# Altium footprint library Molex FFC - FPC Connectors (SMT).PcbLib: 638 footprints (part 3 of 40)
Each footprint in its own frame and in the unit in brackets; x right, y up, seen from the top. Pads: shape width x height; smd on the part's side, far side on the other; paste and mask are expansions set on the pad; w line width, h text height; cw(c..) or ccw(c..) is an arc to the next point about the centre after c.
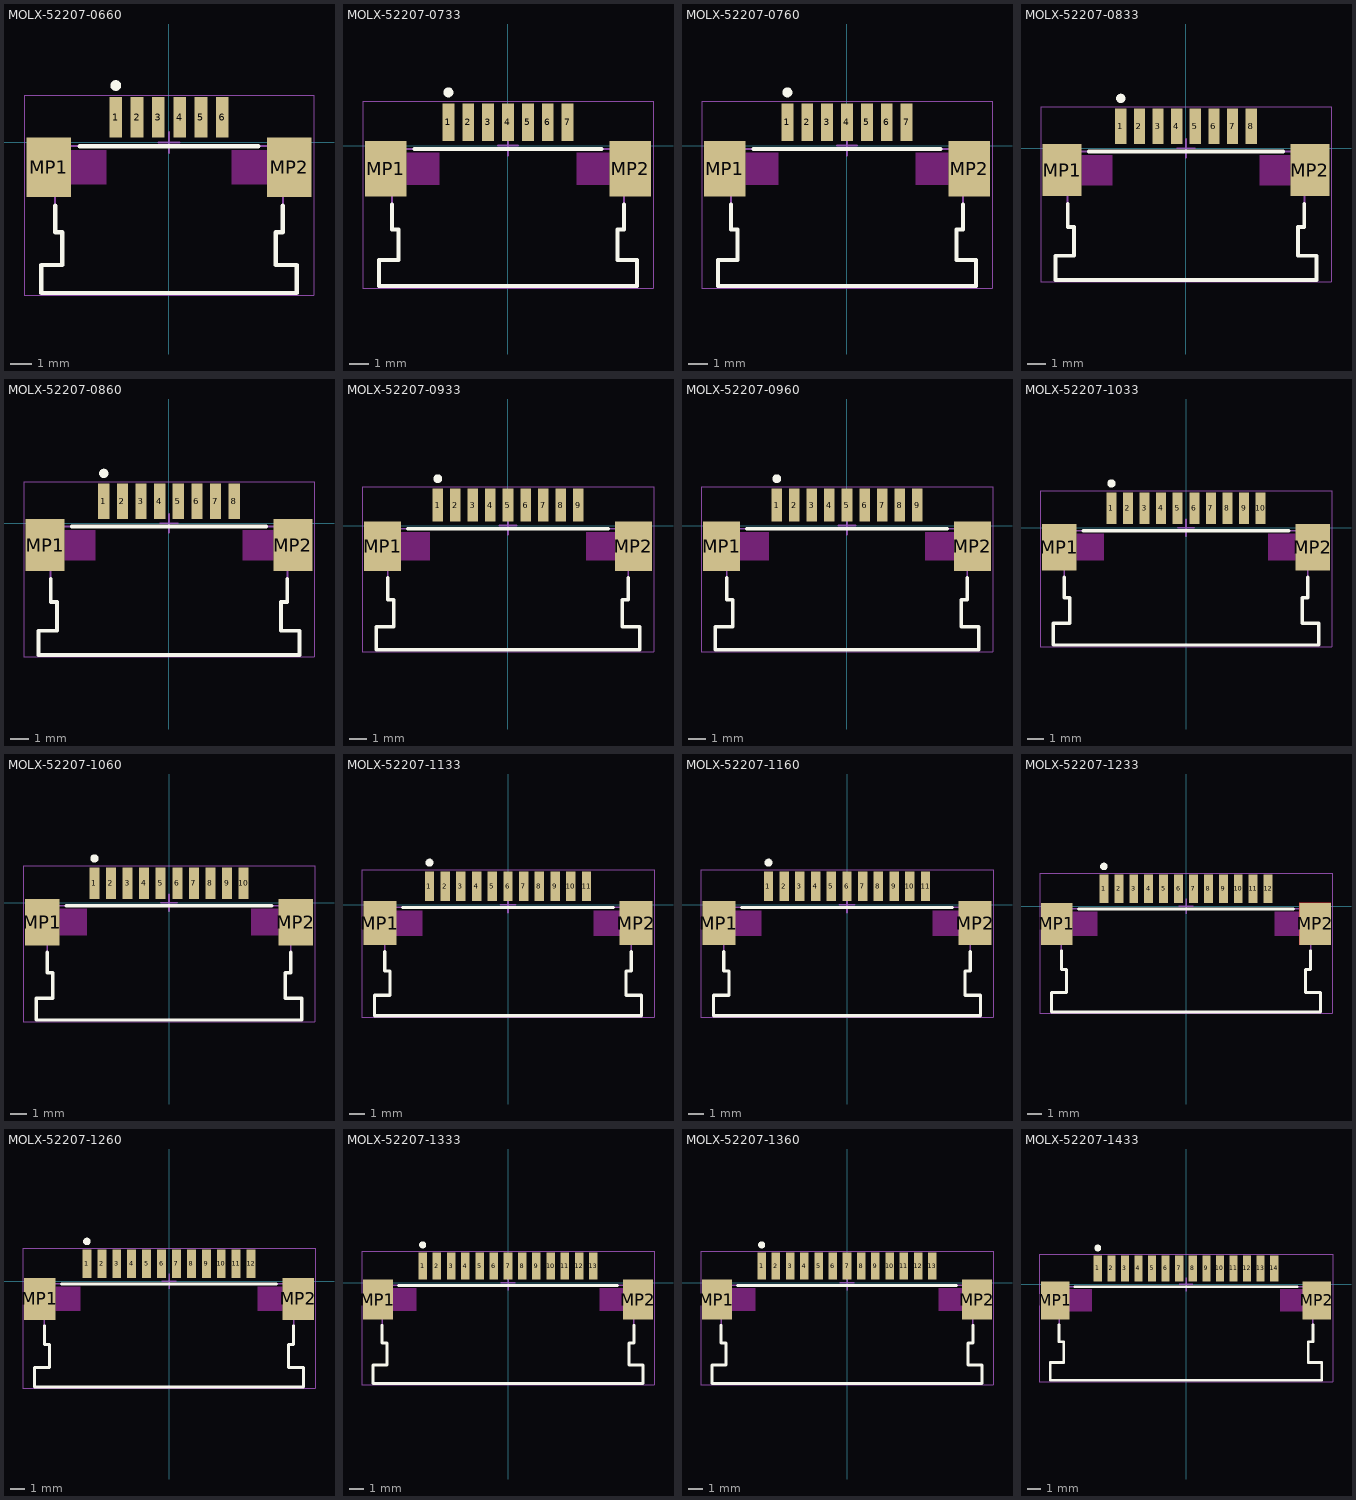
[diagram p2: the footprints below, top view; thin cyan lines are the x and y axes]

## MOLX-52207-0660 [mm] "FPC Connector, 6-Leads, Right Angle, Pitch 1.0 mm, Mated Height 2.7 mm, SMT"
height 2.712
pads (8):
  rect 0.6x1.9 smd: 1(-2.5,1.175) 2(-1.5,1.175) 3(-0.5,1.175) 4(0.5,1.175) 5(1.5,1.175) 6(2.5,1.175)
  rect 2.1x2.8 smd: MP1(-5.65,-1.175) MP2(5.65,-1.175)
Top Overlay:
  circle w0.25: c-2.5,2.675 r0.125
  lines w0.2: -5.35,-2.975 -5.35,-4.225 -5.013,-4.225 -5.012,-5.765 -6,-5.765 -6,-7.075 6,-7.075 6,-5.765 5.012,-5.765 5.012,-4.225 5.35,-4.225 5.35,-2.975 ; -4.2,-0.175 4.2,-0.175
Keep-Out Layer:
  region: -4.6,-0.375 -2.95,-0.375 -2.95,-1.975 -4.6,-1.975
  region: 4.6,-0.375 2.95,-0.375 2.95,-1.975 4.6,-1.975
Mechanical 13:
  lines w0.1: -6.15,-2.175 -6.15,-0.175 6.15,-0.175 6.15,-2.175 5.35,-2.175 5.35,-4.225 5.013,-4.225 5.012,-5.765 6,-5.765 6,-7.075 -6,-7.075 -6,-5.765 -5.012,-5.765 -5.012,-4.225 -5.35,-4.225 -5.35,-2.175 -6.15,-2.175
Mechanical 15:
  lines w0.05: -6.8,-7.175 -6.8,2.225 6.8,2.225 6.8,-7.175 -6.8,-7.175
  lines w0.1: -0.5,0 0.5,0 ; 0,-0.5 0,0.5
3D body: height 0.25, standoff 0, extent -6.15,-7.075 6.15,1.825

## MOLX-52207-0733 [mm] "FPC Connector, 7-Leads, Right Angle, Pitch 1.0 mm, Mated Height 2.7 mm, SMT"
height 2.712
pads (9):
  rect 0.6x1.9 smd: 1(-3,1.175) 2(-2,1.175) 3(-1,1.175) 4(0,1.175) 5(1,1.175) 6(2,1.175) 7(3,1.175)
  rect 2.1x2.8 smd: MP1(-6.15,-1.175) MP2(6.15,-1.175)
Top Overlay:
  circle w0.25: c-3,2.675 r0.125
  lines w0.2: -5.85,-2.975 -5.85,-4.225 -5.513,-4.225 ; -5.512,-4.225 -5.512,-5.765 -6.5,-5.765 -6.5,-7.075 6.5,-7.075 6.5,-5.765 5.512,-5.765 5.512,-4.225 ; -4.7,-0.175 4.7,-0.175 ; 5.513,-4.225 5.85,-4.225 5.85,-2.975
Keep-Out Layer:
  region: -5.1,-0.375 -3.45,-0.375 -3.45,-1.975 -5.1,-1.975
  region: 5.1,-0.375 3.45,-0.375 3.45,-1.975 5.1,-1.975
Mechanical 13:
  lines w0.1: -5.512,-4.225 -5.85,-4.225 -5.85,-2.175 -6.65,-2.175 -6.65,-0.175 6.65,-0.175 6.65,-2.175 5.85,-2.175 5.85,-4.225 5.513,-4.225 ; -5.512,-4.225 -5.512,-5.765 -6.5,-5.765 -6.5,-7.075 6.5,-7.075 6.5,-5.765 5.512,-5.765 5.512,-4.225
Mechanical 15:
  lines w0.05: -7.3,-7.175 -7.3,2.225 7.3,2.225 7.3,-7.175 -7.3,-7.175
  lines w0.1: -0.5,0 0.5,0 ; 0,-0.5 0,0.5
3D body: height 0.25, standoff 0, extent -6.65,-7.075 6.65,1.825

## MOLX-52207-0760 [mm] "FPC Connector, 7-Leads, Right Angle, Pitch 1.0 mm, Mated Height 2.7 mm, SMT"
height 2.712
pads (9):
  rect 0.6x1.9 smd: 1(-3,1.175) 2(-2,1.175) 3(-1,1.175) 4(0,1.175) 5(1,1.175) 6(2,1.175) 7(3,1.175)
  rect 2.1x2.8 smd: MP1(-6.15,-1.175) MP2(6.15,-1.175)
Top Overlay:
  circle w0.25: c-3,2.675 r0.125
  lines w0.2: -5.85,-2.975 -5.85,-4.225 -5.513,-4.225 ; -5.512,-4.225 -5.512,-5.765 -6.5,-5.765 -6.5,-7.075 6.5,-7.075 6.5,-5.765 5.512,-5.765 5.512,-4.225 ; -4.7,-0.175 4.7,-0.175 ; 5.513,-4.225 5.85,-4.225 5.85,-2.975
Keep-Out Layer:
  region: -5.1,-0.375 -3.45,-0.375 -3.45,-1.975 -5.1,-1.975
  region: 5.1,-0.375 3.45,-0.375 3.45,-1.975 5.1,-1.975
Mechanical 13:
  lines w0.1: -5.512,-4.225 -5.85,-4.225 -5.85,-2.175 -6.65,-2.175 -6.65,-0.175 6.65,-0.175 6.65,-2.175 5.85,-2.175 5.85,-4.225 5.513,-4.225 ; -5.512,-4.225 -5.512,-5.765 -6.5,-5.765 -6.5,-7.075 6.5,-7.075 6.5,-5.765 5.512,-5.765 5.512,-4.225
Mechanical 15:
  lines w0.05: -7.3,-7.175 -7.3,2.225 7.3,2.225 7.3,-7.175 -7.3,-7.175
  lines w0.1: -0.5,0 0.5,0 ; 0,-0.5 0,0.5
3D body: height 0.25, standoff 0, extent -6.65,-7.075 6.65,1.825

## MOLX-52207-0833 [mm] "FPC Connector, 8-Leads, Right Angle, Pitch 1.0 mm, Mated Height 2.7 mm, SMT"
height 2.712
pads (10):
  rect 0.6x1.9 smd: 1(-3.5,1.175) 2(-2.5,1.175) 3(-1.5,1.175) 4(-0.5,1.175) 5(0.5,1.175) 6(1.5,1.175) 7(2.5,1.175) 8(3.5,1.175)
  rect 2.1x2.8 smd: MP1(-6.65,-1.175) MP2(6.65,-1.175)
Top Overlay:
  circle w0.25: c-3.5,2.675 r0.125
  lines w0.2: -6.35,-2.975 -6.35,-4.225 -6.013,-4.225 -6.012,-5.765 -7,-5.765 -7,-7.075 7,-7.075 7,-5.765 6.012,-5.765 6.012,-4.225 6.35,-4.225 6.35,-2.975 ; -5.2,-0.175 5.2,-0.175
Keep-Out Layer:
  region: -5.6,-0.375 -3.95,-0.375 -3.95,-1.975 -5.6,-1.975
  region: 5.6,-0.375 3.95,-0.375 3.95,-1.975 5.6,-1.975
Mechanical 13:
  lines w0.1: -7.15,-2.175 -7.15,-0.175 7.15,-0.175 7.15,-2.175 6.35,-2.175 6.35,-4.225 6.013,-4.225 6.012,-5.765 7,-5.765 7,-7.075 -7,-7.075 -7,-5.765 -6.012,-5.765 -6.012,-4.225 -6.35,-4.225 -6.35,-2.175 -7.15,-2.175
Mechanical 15:
  lines w0.05: -7.8,-7.175 -7.8,2.225 7.8,2.225 7.8,-7.175 -7.8,-7.175
  lines w0.1: -0.5,0 0.5,0 ; 0,-0.5 0,0.5
3D body: height 0.25, standoff 0, extent -7.15,-7.075 7.15,1.825

## MOLX-52207-0860 [mm] "FPC Connector, 8-Leads, Right Angle, Pitch 1.0 mm, Mated Height 2.7 mm, SMT"
height 2.712
pads (10):
  rect 0.6x1.9 smd: 1(-3.5,1.175) 2(-2.5,1.175) 3(-1.5,1.175) 4(-0.5,1.175) 5(0.5,1.175) 6(1.5,1.175) 7(2.5,1.175) 8(3.5,1.175)
  rect 2.1x2.8 smd: MP1(-6.65,-1.175) MP2(6.65,-1.175)
Top Overlay:
  circle w0.25: c-3.5,2.675 r0.125
  lines w0.2: -6.35,-2.975 -6.35,-4.225 -6.013,-4.225 -6.012,-5.765 -7,-5.765 -7,-7.075 7,-7.075 7,-5.765 6.012,-5.765 6.012,-4.225 6.35,-4.225 6.35,-2.975 ; -5.2,-0.175 5.2,-0.175
Keep-Out Layer:
  region: 5.6,-0.375 3.95,-0.375 3.95,-1.975 5.6,-1.975
  region: -5.6,-0.375 -3.95,-0.375 -3.95,-1.975 -5.6,-1.975
Mechanical 13:
  lines w0.1: -7.15,-2.175 -6.35,-2.175 -6.35,-4.225 -6.012,-4.225 -6.012,-5.765 -7,-5.765 -7,-7.075 7,-7.075 7,-5.765 6.012,-5.765 6.012,-4.225 6.35,-4.225 6.35,-2.175 7.15,-2.175 7.15,-0.175 -7.15,-0.175 -7.15,-2.175
Mechanical 15:
  lines w0.05: -7.8,-7.175 7.8,-7.175 7.8,2.225 -7.8,2.225 -7.8,-7.175
  lines w0.1: -0.5,0 0.5,0 ; 0,-0.5 0,0.5
3D body: height 0.25, standoff 0, extent -7.15,-7.075 7.15,1.825

## MOLX-52207-0933 [mm] "FPC Connector, 9-Leads, Right Angle, Pitch 1.0 mm, Mated Height 2.7 mm, SMT"
height 2.712
pads (11):
  rect 0.6x1.9 smd: 1(-4,1.175) 2(-3,1.175) 3(-2,1.175) 4(-1,1.175) 5(0,1.175) 6(1,1.175) 7(2,1.175) 8(3,1.175) 9(4,1.175)
  rect 2.1x2.8 smd: MP1(-7.15,-1.175) MP2(7.15,-1.175)
Top Overlay:
  circle w0.25: c-4,2.675 r0.125
  lines w0.2: -6.85,-2.975 -6.85,-4.225 -6.513,-4.225 -6.512,-5.765 -7.5,-5.765 -7.5,-7.075 7.5,-7.075 7.5,-5.765 6.512,-5.765 6.512,-4.225 6.85,-4.225 6.85,-2.975 ; -5.7,-0.175 5.7,-0.175
Keep-Out Layer:
  region: 6.1,-0.375 4.45,-0.375 4.45,-1.975 6.1,-1.975
  region: -6.1,-0.375 -4.45,-0.375 -4.45,-1.975 -6.1,-1.975
Mechanical 13:
  lines w0.1: -7.5,-5.765 -6.512,-5.765 -6.512,-4.225 -6.85,-4.225 -6.85,-2.175 -7.65,-2.175 -7.65,-0.175 7.65,-0.175 7.65,-2.175 6.85,-2.175 6.85,-4.225 6.512,-4.225 6.512,-5.765 7.5,-5.765 7.5,-7.075 -7.5,-7.075 -7.5,-5.765
Mechanical 15:
  lines w0.05: -8.3,-7.175 8.3,-7.175 8.3,2.225 -8.3,2.225 -8.3,-7.175
  lines w0.1: -0.5,0 0.5,0 ; 0,-0.5 0,0.5
3D body: height 0.25, standoff 0, extent -7.65,-7.075 7.65,1.825

## MOLX-52207-0960 [mm] "FPC Connector, 9-Leads, Right Angle, Pitch 1.0 mm, Mated Height 2.7 mm, SMT"
height 2.712
pads (11):
  rect 0.6x1.9 smd: 1(-4,1.175) 2(-3,1.175) 3(-2,1.175) 4(-1,1.175) 5(0,1.175) 6(1,1.175) 7(2,1.175) 8(3,1.175) 9(4,1.175)
  rect 2.1x2.8 smd: MP1(-7.15,-1.175) MP2(7.15,-1.175)
Top Overlay:
  circle w0.25: c-4,2.675 r0.125
  lines w0.2: -6.85,-2.975 -6.85,-4.225 -6.513,-4.225 -6.512,-5.765 -7.5,-5.765 -7.5,-7.075 7.5,-7.075 7.5,-5.765 6.512,-5.765 6.512,-4.225 6.85,-4.225 6.85,-2.975 ; -5.7,-0.175 5.7,-0.175
Keep-Out Layer:
  region: 6.1,-0.375 4.45,-0.375 4.45,-1.975 6.1,-1.975
  region: -6.1,-0.375 -4.45,-0.375 -4.45,-1.975 -6.1,-1.975
Mechanical 13:
  lines w0.1: -7.5,-5.765 -6.512,-5.765 -6.512,-4.225 -6.85,-4.225 -6.85,-2.175 -7.65,-2.175 -7.65,-0.175 7.65,-0.175 7.65,-2.175 6.85,-2.175 6.85,-4.225 6.512,-4.225 6.512,-5.765 7.5,-5.765 7.5,-7.075 -7.5,-7.075 -7.5,-5.765
Mechanical 15:
  lines w0.05: -8.3,-7.175 8.3,-7.175 8.3,2.225 -8.3,2.225 -8.3,-7.175
  lines w0.1: -0.5,0 0.5,0 ; 0,-0.5 0,0.5
3D body: height 0.25, standoff 0, extent -7.65,-7.075 7.65,1.825

## MOLX-52207-1033 [mm] "FPC Connector, 10-Leads, Right Angle, Pitch 1.0 mm, Mated Height 2.7 mm, SMT"
height 2.712
pads (12):
  rect 0.6x1.9 smd: 1(-4.5,1.175) 2(-3.5,1.175) 3(-2.5,1.175) 4(-1.5,1.175) 5(-0.5,1.175) 6(0.5,1.175) 7(1.5,1.175) 8(2.5,1.175) 9(3.5,1.175) 10(4.5,1.175)
  rect 2.1x2.8 smd: MP1(-7.65,-1.175) MP2(7.65,-1.175)
Top Overlay:
  circle w0.25: c-4.5,2.675 r0.125
  lines w0.2: -7.35,-2.975 -7.35,-4.225 -7.013,-4.225 -7.012,-5.765 -8,-5.765 -8,-7.075 8,-7.075 8,-5.765 7.012,-5.765 7.012,-4.225 7.35,-4.225 7.35,-2.975 ; -6.2,-0.175 6.2,-0.175
Keep-Out Layer:
  region: -6.6,-0.375 -4.95,-0.375 -4.95,-1.975 -6.6,-1.975
  region: 6.6,-0.375 4.95,-0.375 4.95,-1.975 6.6,-1.975
Mechanical 13:
  lines w0.1: -8.15,-2.175 -8.15,-0.175 8.15,-0.175 8.15,-2.175 7.35,-2.175 7.35,-4.225 7.012,-4.225 7.012,-5.765 8,-5.765 8,-7.075 -8,-7.075 -8,-5.765 -7.012,-5.765 -7.012,-4.225 -7.35,-4.225 -7.35,-2.175 -8.15,-2.175
Mechanical 15:
  lines w0.05: -8.8,-7.175 -8.8,2.225 8.8,2.225 8.8,-7.175 -8.8,-7.175
  lines w0.1: -0.5,0 0.5,0 ; 0,-0.5 0,0.5
3D body: height 0.25, standoff 0, extent -8.15,-7.075 8.15,1.825

## MOLX-52207-1060 [mm] "FPC Connector, 10-Leads, Right Angle, Pitch 1.0 mm, Mated Height 2.7 mm, SMT"
height 2.712
pads (12):
  rect 0.6x1.9 smd: 1(-4.5,1.175) 2(-3.5,1.175) 3(-2.5,1.175) 4(-1.5,1.175) 5(-0.5,1.175) 6(0.5,1.175) 7(1.5,1.175) 8(2.5,1.175) 9(3.5,1.175) 10(4.5,1.175)
  rect 2.1x2.8 smd: MP1(-7.65,-1.175) MP2(7.65,-1.175)
Top Overlay:
  circle w0.25: c-4.5,2.675 r0.125
  lines w0.2: -7.35,-2.975 -7.35,-4.225 -7.013,-4.225 -7.012,-5.765 -8,-5.765 -8,-7.075 8,-7.075 8,-5.765 7.012,-5.765 7.012,-4.225 7.35,-4.225 7.35,-2.975 ; -6.2,-0.175 6.2,-0.175
Keep-Out Layer:
  region: -6.6,-0.375 -4.95,-0.375 -4.95,-1.975 -6.6,-1.975
  region: 6.6,-0.375 4.95,-0.375 4.95,-1.975 6.6,-1.975
Mechanical 13:
  lines w0.1: -8.15,-2.175 -8.15,-0.175 8.15,-0.175 8.15,-2.175 7.35,-2.175 7.35,-4.225 7.012,-4.225 7.012,-5.765 8,-5.765 8,-7.075 -8,-7.075 -8,-5.765 -7.012,-5.765 -7.012,-4.225 -7.35,-4.225 -7.35,-2.175 -8.15,-2.175
Mechanical 15:
  lines w0.05: -8.8,-7.175 -8.8,2.225 8.8,2.225 8.8,-7.175 -8.8,-7.175
  lines w0.1: -0.5,0 0.5,0 ; 0,-0.5 0,0.5
3D body: height 0.25, standoff 0, extent -8.15,-7.075 8.15,1.825

## MOLX-52207-1133 [mm] "FPC Connector, 11-Leads, Right Angle, Pitch 1.0 mm, Mated Height 2.7 mm, SMT"
height 2.712
pads (13):
  rect 0.6x1.9 smd: 1(-5,1.175) 2(-4,1.175) 3(-3,1.175) 4(-2,1.175) 5(-1,1.175) 6(0,1.175) 7(1,1.175) 8(2,1.175) 9(3,1.175) 10(4,1.175) 11(5,1.175)
  rect 2.1x2.8 smd: MP1(-8.15,-1.175) MP2(8.15,-1.175)
Top Overlay:
  circle w0.25: c-5,2.675 r0.125
  lines w0.2: -7.85,-2.975 -7.85,-4.225 -7.513,-4.225 -7.512,-5.765 -8.5,-5.765 -8.5,-7.075 8.5,-7.075 8.5,-5.765 7.512,-5.765 7.512,-4.225 7.85,-4.225 7.85,-2.975 ; -6.7,-0.175 6.7,-0.175
Keep-Out Layer:
  region: -7.1,-0.375 -5.45,-0.375 -5.45,-1.975 -7.1,-1.975
  region: 7.1,-0.375 5.45,-0.375 5.45,-1.975 7.1,-1.975
Mechanical 13:
  lines w0.1: -8.65,-2.175 -8.65,-0.175 8.65,-0.175 8.65,-2.175 7.85,-2.175 7.85,-4.225 7.512,-4.225 7.512,-5.765 8.5,-5.765 8.5,-7.075 -8.5,-7.075 -8.5,-5.765 -7.512,-5.765 -7.512,-4.225 -7.85,-4.225 -7.85,-2.175 -8.65,-2.175
Mechanical 15:
  lines w0.05: -9.3,-7.175 -9.3,2.225 9.3,2.225 9.3,-7.175 -9.3,-7.175
  lines w0.1: -0.5,0 0.5,0 ; 0,-0.5 0,0.5
3D body: height 0.25, standoff 0, extent -8.65,-7.075 8.65,1.825

## MOLX-52207-1160 [mm] "FPC Connector, 11-Leads, Right Angle, Pitch 1.0 mm, Mated Height 2.7 mm, SMT"
height 2.712
pads (13):
  rect 0.6x1.9 smd: 1(-5,1.175) 2(-4,1.175) 3(-3,1.175) 4(-2,1.175) 5(-1,1.175) 6(0,1.175) 7(1,1.175) 8(2,1.175) 9(3,1.175) 10(4,1.175) 11(5,1.175)
  rect 2.1x2.8 smd: MP1(-8.15,-1.175) MP2(8.15,-1.175)
Top Overlay:
  circle w0.25: c-5,2.675 r0.125
  lines w0.2: -7.85,-2.975 -7.85,-4.225 -7.513,-4.225 -7.512,-5.765 -8.5,-5.765 -8.5,-7.075 8.5,-7.075 8.5,-5.765 7.512,-5.765 7.512,-4.225 7.85,-4.225 7.85,-2.975 ; -6.7,-0.175 6.7,-0.175
Keep-Out Layer:
  region: 7.1,-0.375 5.45,-0.375 5.45,-1.975 7.1,-1.975
  region: -7.1,-0.375 -5.45,-0.375 -5.45,-1.975 -7.1,-1.975
Mechanical 13:
  lines w0.1: -8.65,-2.175 -7.85,-2.175 -7.85,-4.225 -7.512,-4.225 -7.512,-5.765 -8.5,-5.765 -8.5,-7.075 8.5,-7.075 8.5,-5.765 7.512,-5.765 7.512,-4.225 7.85,-4.225 7.85,-2.175 8.65,-2.175 8.65,-0.175 -8.65,-0.175 -8.65,-2.175
Mechanical 15:
  lines w0.05: -9.3,-7.175 9.3,-7.175 9.3,2.225 -9.3,2.225 -9.3,-7.175
  lines w0.1: -0.5,0 0.5,0 ; 0,-0.5 0,0.5
3D body: height 0.25, standoff 0, extent -8.65,-7.075 8.65,1.825

## MOLX-52207-1233 [mm] "FPC Connector, 12-Leads, Right Angle, Pitch 1.0 mm, Mated Height 2.7 mm, SMT"
height 2.712
pads (14):
  rect 0.6x1.9 smd: 1(-5.5,1.175) 2(-4.5,1.175) 3(-3.5,1.175) 4(-2.5,1.175) 5(-1.5,1.175) 6(-0.5,1.175) 7(0.5,1.175) 8(1.5,1.175) 9(2.5,1.175) 10(3.5,1.175) 11(4.5,1.175) 12(5.5,1.175)
  rect 2.1x2.8 smd: MP1(-8.65,-1.175) MP2(8.65,-1.175)
Top Layer:
  region: 9.7,0.225 7.6,0.225 7.6,-2.575 9.7,-2.575
Top Overlay:
  circle w0.25: c-5.5,2.675 r0.125
  lines w0.2: -8.35,-2.975 -8.35,-4.225 -8.013,-4.225 -8.012,-5.765 -9,-5.765 -9,-7.075 9,-7.075 9,-5.765 8.012,-5.765 8.012,-4.225 8.35,-4.225 8.35,-2.975 ; -7.2,-0.175 7.2,-0.175
Keep-Out Layer:
  region: -7.6,-0.375 -5.95,-0.375 -5.95,-1.975 -7.6,-1.975
  region: 7.6,-0.375 5.95,-0.375 5.95,-1.975 7.6,-1.975
Mechanical 13:
  lines w0.1: -9.15,-2.175 -9.15,-0.175 9.15,-0.175 9.15,-2.175 8.35,-2.175 8.35,-4.225 8.012,-4.225 8.012,-5.765 9,-5.765 9,-7.075 -9,-7.075 -9,-5.765 -8.012,-5.765 -8.012,-4.225 -8.35,-4.225 -8.35,-2.175 -9.15,-2.175
Mechanical 15:
  lines w0.05: -9.8,-7.175 -9.8,2.225 9.8,2.225 9.8,-7.175 -9.8,-7.175
  lines w0.1: -0.5,0 0.5,0 ; 0,-0.5 0,0.5
3D body: height 0.25, standoff 0, extent -9.15,-7.075 9.15,1.825

## MOLX-52207-1260 [mm] "FPC Connector, 12-Leads, Right Angle, Pitch 1.0 mm, Mated Height 2.7 mm, SMT"
height 2.712
pads (14):
  rect 0.6x1.9 smd: 1(-5.5,1.175) 2(-4.5,1.175) 3(-3.5,1.175) 4(-2.5,1.175) 5(-1.5,1.175) 6(-0.5,1.175) 7(0.5,1.175) 8(1.5,1.175) 9(2.5,1.175) 10(3.5,1.175) 11(4.5,1.175) 12(5.5,1.175)
  rect 2.1x2.8 smd: MP1(-8.65,-1.175) MP2(8.65,-1.175)
Top Overlay:
  circle w0.25: c-5.5,2.675 r0.125
  lines w0.2: -8.35,-2.975 -8.35,-4.225 -8.013,-4.225 -8.012,-5.765 -9,-5.765 -9,-7.075 9,-7.075 9,-5.765 8.012,-5.765 8.012,-4.225 8.35,-4.225 8.35,-2.975 ; -7.2,-0.175 7.2,-0.175
Keep-Out Layer:
  region: 7.6,-0.375 5.95,-0.375 5.95,-1.975 7.6,-1.975
  region: -7.6,-0.375 -5.95,-0.375 -5.95,-1.975 -7.6,-1.975
Mechanical 13:
  lines w0.1: -9.15,-2.175 -8.35,-2.175 -8.35,-4.225 -8.012,-4.225 -8.012,-5.765 -9,-5.765 -9,-7.075 9,-7.075 9,-5.765 8.012,-5.765 8.012,-4.225 8.35,-4.225 8.35,-2.175 9.15,-2.175 9.15,-0.175 -9.15,-0.175 -9.15,-2.175
Mechanical 15:
  lines w0.05: -9.8,-7.175 9.8,-7.175 9.8,2.225 -9.8,2.225 -9.8,-7.175
  lines w0.1: -0.5,0 0.5,0 ; 0,-0.5 0,0.5
3D body: height 0.25, standoff 0, extent -9.15,-7.075 9.15,1.825

## MOLX-52207-1333 [mm] "FPC Connector, 13-Leads, Right Angle, Pitch 1.0 mm, Mated Height 2.7 mm, SMT"
height 2.712
pads (15):
  rect 0.6x1.9 smd: 1(-6,1.175) 2(-5,1.175) 3(-4,1.175) 4(-3,1.175) 5(-2,1.175) 6(-1,1.175) 7(0,1.175) 8(1,1.175) 9(2,1.175) 10(3,1.175) 11(4,1.175) 12(5,1.175) 13(6,1.175)
  rect 2.1x2.8 smd: MP1(-9.15,-1.175) MP2(9.15,-1.175)
Top Overlay:
  circle w0.25: c-6,2.675 r0.125
  lines w0.2: -8.85,-2.975 -8.85,-4.225 -8.513,-4.225 -8.512,-5.765 -9.5,-5.765 -9.5,-7.075 9.5,-7.075 9.5,-5.765 8.512,-5.765 8.512,-4.225 8.85,-4.225 8.85,-2.975 ; -7.7,-0.175 7.7,-0.175
Keep-Out Layer:
  region: -8.1,-0.375 -6.45,-0.375 -6.45,-1.975 -8.1,-1.975
  region: 8.1,-0.375 6.45,-0.375 6.45,-1.975 8.1,-1.975
Mechanical 13:
  lines w0.1: -8.85,-2.175 -9.65,-2.175 -9.65,-0.175 9.65,-0.175 9.65,-2.175 8.85,-2.175 ; -8.85,-2.175 -8.85,-4.225 -8.512,-4.225 -8.512,-5.765 -9.5,-5.765 -9.5,-7.075 9.5,-7.075 9.5,-5.765 8.512,-5.765 8.512,-4.225 8.85,-4.225 8.85,-2.175
Mechanical 15:
  lines w0.05: -10.3,-7.175 -10.3,2.225 10.3,2.225 10.3,-7.175 -10.3,-7.175
  lines w0.1: -0.5,0 0.5,0 ; 0,-0.5 0,0.5
3D body: height 0.25, standoff 0, extent -9.65,-7.075 9.65,1.825

## MOLX-52207-1360 [mm] "FPC Connector, 13-Leads, Right Angle, Pitch 1.0 mm, Mated Height 2.7 mm, SMT"
height 2.712
pads (15):
  rect 0.6x1.9 smd: 1(-6,1.175) 2(-5,1.175) 3(-4,1.175) 4(-3,1.175) 5(-2,1.175) 6(-1,1.175) 7(0,1.175) 8(1,1.175) 9(2,1.175) 10(3,1.175) 11(4,1.175) 12(5,1.175) 13(6,1.175)
  rect 2.1x2.8 smd: MP1(-9.15,-1.175) MP2(9.15,-1.175)
Top Overlay:
  circle w0.25: c-6,2.675 r0.125
  lines w0.2: -8.85,-2.975 -8.85,-4.225 -8.513,-4.225 -8.512,-5.765 -9.5,-5.765 -9.5,-7.075 9.5,-7.075 9.5,-5.765 8.512,-5.765 8.512,-4.225 8.85,-4.225 8.85,-2.975 ; -7.7,-0.175 7.7,-0.175
Keep-Out Layer:
  region: -8.1,-0.375 -6.45,-0.375 -6.45,-1.975 -8.1,-1.975
  region: 8.1,-0.375 6.45,-0.375 6.45,-1.975 8.1,-1.975
Mechanical 13:
  lines w0.1: -8.85,-2.175 -9.65,-2.175 -9.65,-0.175 9.65,-0.175 9.65,-2.175 8.85,-2.175 ; -8.85,-2.175 -8.85,-4.225 -8.512,-4.225 -8.512,-5.765 -9.5,-5.765 -9.5,-7.075 9.5,-7.075 9.5,-5.765 8.512,-5.765 8.512,-4.225 8.85,-4.225 8.85,-2.175
Mechanical 15:
  lines w0.05: -10.3,-7.175 -10.3,2.225 10.3,2.225 10.3,-7.175 -10.3,-7.175
  lines w0.1: -0.5,0 0.5,0 ; 0,-0.5 0,0.5
3D body: height 0.25, standoff 0, extent -9.65,-7.075 9.65,1.825

## MOLX-52207-1433 [mm] "FPC Connector, 14-Leads, Right Angle, Pitch 1.0 mm, Mated Height 2.7 mm, SMT"
height 2.712
pads (16):
  rect 0.6x1.9 smd: 1(-6.5,1.175) 2(-5.5,1.175) 3(-4.5,1.175) 4(-3.5,1.175) 5(-2.5,1.175) 6(-1.5,1.175) 7(-0.5,1.175) 8(0.5,1.175) 9(1.5,1.175) 10(2.5,1.175) 11(3.5,1.175) 12(4.5,1.175) 13(5.5,1.175) 14(6.5,1.175)
  rect 2.1x2.8 smd: MP1(-9.65,-1.175) MP2(9.65,-1.175)
Top Overlay:
  circle w0.25: c-6.5,2.675 r0.125
  lines w0.2: -9.35,-2.975 -9.35,-4.225 -9.013,-4.225 ; -9.012,-4.225 -9.012,-5.765 -10,-5.765 -10,-7.075 10,-7.075 10,-5.765 9.012,-5.765 9.012,-4.225 ; -8.2,-0.175 8.2,-0.175 ; 9.013,-4.225 9.35,-4.225 9.35,-2.975
Keep-Out Layer:
  region: 8.6,-0.375 6.95,-0.375 6.95,-1.975 8.6,-1.975
  region: -8.6,-0.375 -6.95,-0.375 -6.95,-1.975 -8.6,-1.975
Mechanical 13:
  lines w0.1: -10.15,-2.175 -9.35,-2.175 -9.35,-4.225 -9.012,-4.225 -9.012,-5.765 -10,-5.765 -10,-7.075 10,-7.075 10,-5.765 9.012,-5.765 9.012,-4.225 9.35,-4.225 9.35,-2.175 10.15,-2.175 10.15,-0.175 -10.15,-0.175 -10.15,-2.175
Mechanical 15:
  lines w0.05: -10.8,-7.175 10.8,-7.175 10.8,2.225 -10.8,2.225 -10.8,-7.175
  lines w0.1: -0.5,0 0.5,0 ; 0,-0.5 0,0.5
3D body: height 0.25, standoff 0, extent -10.15,-7.075 10.15,1.825